# Altium footprint library usb.PcbLib: 20 footprints (part 1 of 2)
Each footprint in its own frame and in the unit in brackets; x right, y up, seen from the top. Pads: shape width x height; smd on the part's side, far side on the other; paste and mask are expansions set on the pad; w line width, h text height; cw(c..) or ccw(c..) is an arc to the next point about the centre after c.
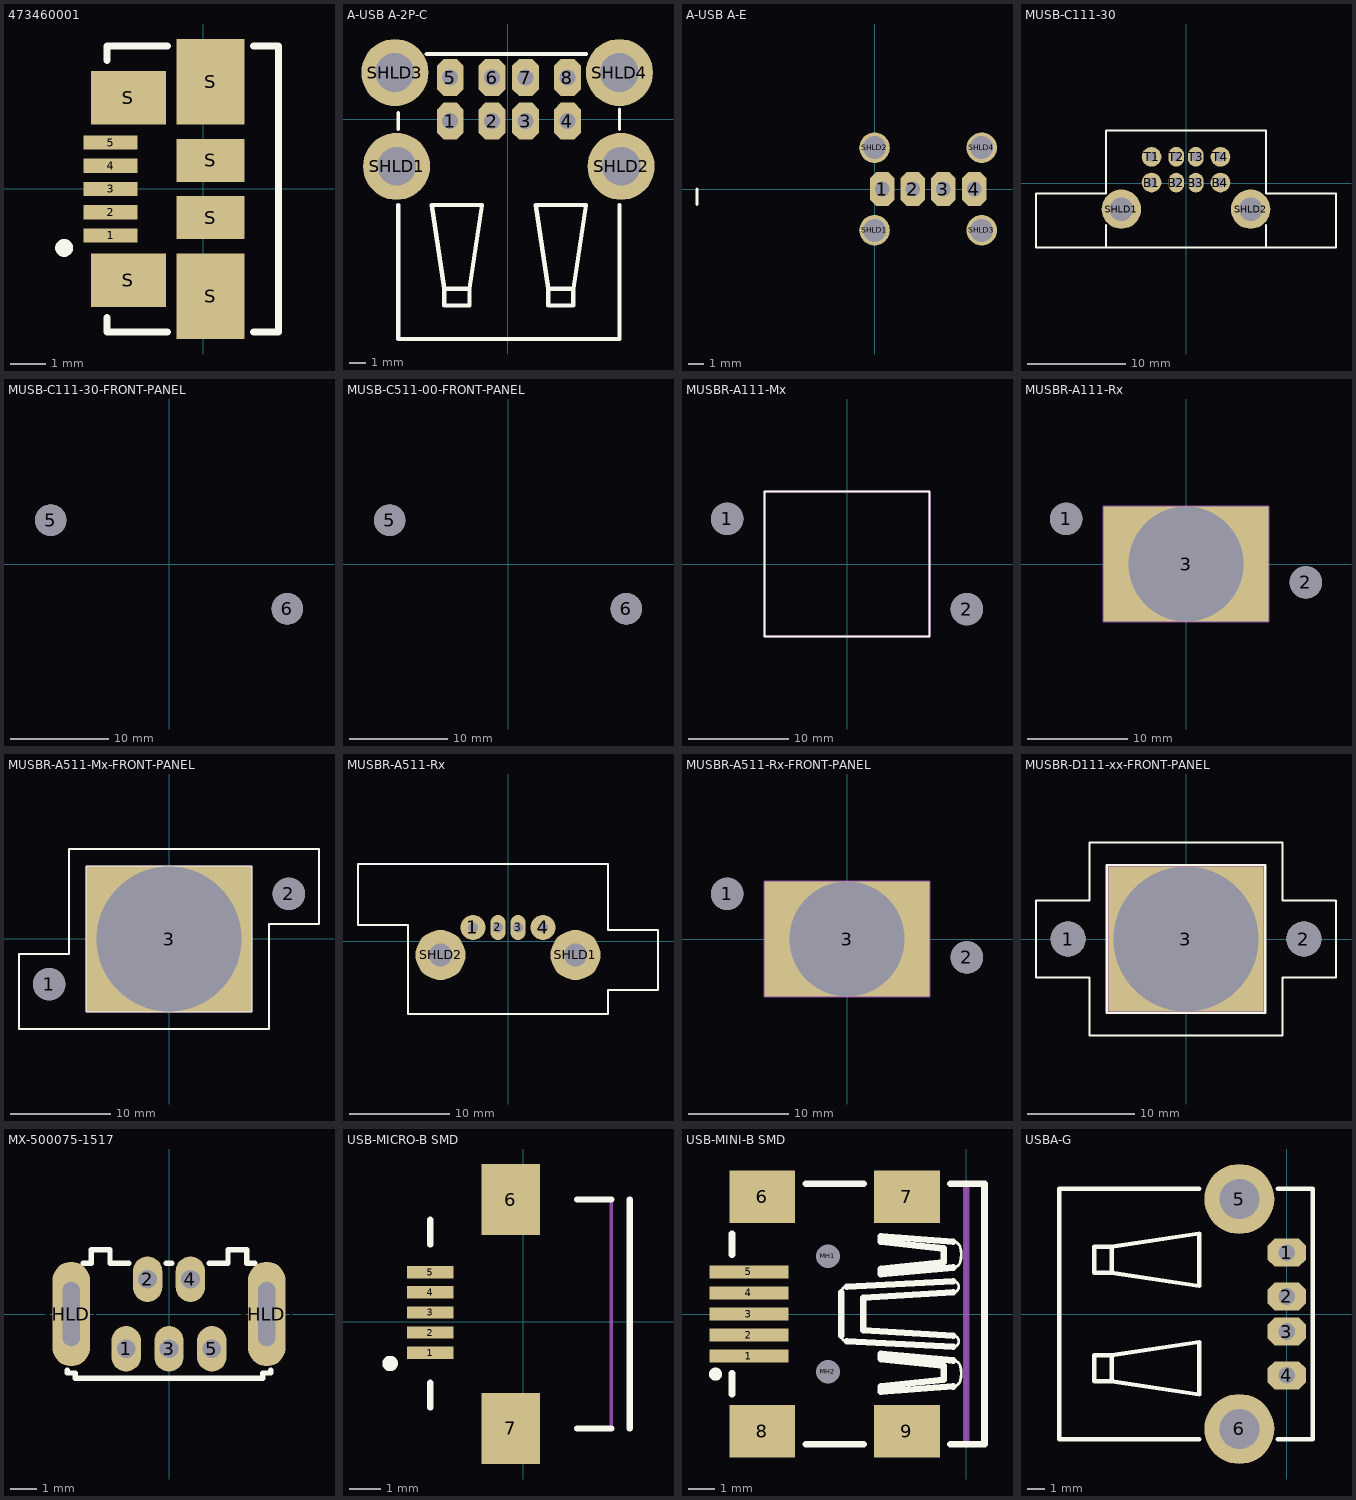
[diagram p0: the footprints below, top view; thin cyan lines are the x and y axes]

## 473460001 [mm] "Molex 473460001 microUSB Connector"
pads (11):
  rect 1.5x0.4 smd: 1(-2.6,-1.3) 2(-2.6,-0.65) 3(-2.6,0) 4(-2.6,0.65) 5(-2.6,1.3)
  rect 2.1x1.5 smd: S(-2.1,-2.55) S(-2.1,2.55)
  rect 1.9x2.4 smd: S(0.2,-3) S(0.2,3)
  rect 1.9x1.2 smd: S(0.2,-0.8) S(0.2,0.8)
Top Overlay:
  circle w0.25: c-3.9,-1.65 r0.125
  lines w0.2: -2.7,-3.6 -2.7,-4 -1,-4 ; -2.7,3.6 -2.7,4 -1,4 ; 1.4,-4 2.1,-4 2.1,4 1.4,4
Mechanical 1:
  lines w0.1: 2.1,-4 2.1,4
  text "PCB Edge" at 3.1,-3.1 h0.8
3D body "473460001.stp": height 2.72, standoff -0.22, extent -2.65,-3.99 2.78,3.99

## A-USB A-2P-C [mm] "ASSMANN WSW USB, style A, dual port, DIP"
pads (12):
  oct 1.6x2.2 hole 0.95: 1(-3.45,-0.1) 2(-0.95,-0.1) 3(1.05,-0.1) 4(3.55,-0.1) 5(-3.45,2.5) 6(-0.95,2.5) 7(1.05,2.5) 8(3.55,2.5)
  round 4 hole 2.3: SHLD1(-6.65,-2.8) SHLD2(6.75,-2.8) SHLD3(-6.75,2.8) SHLD4(6.65,2.8)
Top Overlay:
  lines w0.2: -6.55,-0.6 -6.55,0.4 ; 6.65,-0.6 6.65,0.6
  lines w0.254: -6.55,-5.1 -6.55,-13.1 6.65,-13.1 6.65,-5.1 ; -4.85,3.9 4.65,3.9 ; -3.8,-10.1 -2.3,-10.1 ; -3.8,-10.1 -4.55,-5.1 -1.55,-5.1 -2.3,-10.1 ; -3.8,-10.1 -3.8,-11.1 -2.3,-11.1 -2.3,-10.1 ; 2.4,-10.1 2.4,-11.1 3.9,-11.1 3.9,-10.1 ; 2.4,-10.1 1.65,-5.1 4.65,-5.1 3.9,-10.1 ; 2.4,-10.1 3.9,-10.1
3D body "usb_a-usb_a-2p-c.stp": height 15.6, standoff -3.8, extent -7.8,-13.698 7.9,3.9

## A-USB A-E [mm] "ASSMANN WSW USB, style A, vertical, DIP"
pads (8):
  oct 1.6x2.2 hole 0.95: 1(0.5,0) 2(2.5,0) 3(4.5,0) 4(6.5,0)
  round 2 hole 1.5: SHLD1(0,-2.7) SHLD2(0,2.7) SHLD3(7,-2.7) SHLD4(7,2.7)
Top Overlay:
  lines w0.2: -11.6,-1 -11.6,0
3D body "usb_a-usb_a-e.stp": height 14.55, standoff -3.86, extent -11.6,-3.599 7.6,3.599

## MUSB-C111-30 [mm]
pads (10):
  round 2 hole 1: B1(-3.5,0.045) B4(3.5,0.045) T1(-3.5,2.665) T4(3.5,2.665)
  oval 1.6x2 hole 1: B2(-1,0.045) B3(1,0.045) T2(-1,2.665) T3(1,2.665)
  round 4 hole 2.4: SHLD1(-6.57,-2.665) SHLD2(6.57,-2.665)
Top Overlay:
  lines w0.2: -8.125,-4.265 -8.125,-6.575 ; 8.125,-4.265 8.125,-6.575 ; -8.125,-6.575 -15.25,-6.575 -15.25,-1.165 -15.25,-1.065 -8.125,-1.065 -8.125,5.36 8.125,5.36 8.125,-1.065 15.25,-1.065 15.25,-1.165 15.25,-6.575 8.125,-6.575 ; -8.125,-6.575 8.125,-6.575
3D body "M-MUSB-C111-30-REVT4.STEP": height 19.4, standoff -2.43, extent -15.25,-13.84 15.25,5.36

## MUSB-C111-30-FRONT-PANEL [mm]
pads (2):
  round 3.2 hole 3.2: 5(-12,4.5) 6(12,-4.5)
Bottom Overlay:
  lines w0.2: 9.6,9 ccw(c8.1,9) 8.1,10.5 -8.1,10.5 ccw(c-8.1,9) -9.6,9 -9.6,8.5 cw(c-10.6,8.5) -10.6,7.5 -13.325,7.5 ccw(c-13.325,5.625) -15.2,5.625 -15.2,3.375 ccw(c-13.325,3.375) -13.325,1.5 -10.6,1.5 cw(c-10.6,0.5) -9.6,0.5 -9.6,-8.9 ; -9.6,-8.9 ccw(c-8.1,-8.9) -8.1,-10.4 8.1,-10.4 ccw(c8.1,-8.9) 9.6,-8.9 9.6,-8.5 cw(c10.6,-8.5) 10.6,-7.5 13.325,-7.5 ccw(c13.325,-5.625) 15.2,-5.625 15.2,-3.375 ccw(c13.325,-3.375) 13.325,-1.5 10.6,-1.5 cw(c10.6,-0.5) 9.6,-0.5 9.6,8.9 ; -9.6,-8.9 -9.6,-8.9 ; 9.6,8.9 9.6,8.9
  lines w0.254: -8.25,-9 8.25,-9 8.25,9 -8.25,9 -8.25,-9
3D body "M-MUSB-C111-30-REVT4.STEP": height 15.2, standoff -4, extent -15.25,-11.325 15.25,10.5

## MUSB-C511-00-FRONT-PANEL [mm]
pads (2):
  round 3.2 hole 3.2: 5(-12,4.5) 6(12,-4.5)
Bottom Overlay:
  lines w0.2: 9.6,9 ccw(c8.1,9) 8.1,10.5 -8.1,10.5 ccw(c-8.1,9) -9.6,9 -9.6,8.5 cw(c-10.6,8.5) -10.6,7.5 -13.325,7.5 ccw(c-13.325,5.625) -15.2,5.625 -15.2,3.375 ccw(c-13.325,3.375) -13.325,1.5 -10.6,1.5 cw(c-10.6,0.5) -9.6,0.5 -9.6,-8.9 ; -9.6,-8.9 ccw(c-8.1,-8.9) -8.1,-10.4 8.1,-10.4 ccw(c8.1,-8.9) 9.6,-8.9 9.6,-8.5 cw(c10.6,-8.5) 10.6,-7.5 13.325,-7.5 ccw(c13.325,-5.625) 15.2,-5.625 15.2,-3.375 ccw(c13.325,-3.375) 13.325,-1.5 10.6,-1.5 cw(c10.6,-0.5) 9.6,-0.5 9.6,8.9 ; -9.6,-8.9 -9.6,-8.9 ; 9.6,8.9 9.6,8.9
  lines w0.254: -8.25,-9 -8.25,9 8.25,9 8.25,-9 -8.25,-9
3D body "M-MUSB-C511-00-REVT3.STEP": height 17.76, standoff -4.5, extent -15.25,-10.5 15.25,10.5

## MUSBR-A111-Mx [mm] "AMPHENOL"
pads (2):
  round 3.25 hole 3.25: 1(-12,4.5) 2(12,-4.5)
Top Overlay:
  lines w0.2: -8.275,7.275 -8.25,7.275 ; -8.25,7.275 -8.25,-7.275 8.275,-7.275 8.275,7.25 8.275,7.275 -8.25,7.275
Bottom Overlay:
  lines w0.2: -15,1.5 -10,1.5 -10,-9 10,-9 15,-9 15,-5.5 15,-4 15,-1.5 10,-1.5 10,9 -10,9 -15,9 -15,5.5 -15,4.5 -15,1.5
Mechanical 15:
  lines w0.2: -8.275,-7.275 8.275,-7.275 8.275,7.275 -8.275,7.275 -8.275,-7.275
3D body "M-MUSBR-A111-30-REVT3.STEP": height 3, standoff -14.99, extent -15,-9 15,9

## MUSBR-A111-Rx [mm] "AMPHENOL"
pads (3):
  round 3.25 hole 3.25: 1(-12,4.5) 2(12,-1.85)
  rect 16.55x11.55 hole 11.55 square: 3(0,0)
Bottom Overlay:
  lines w0.2: -15,1.5 -10,1.5 -10,-7.5 8.5,-7.5 10,-7.5 10,-5 15,-5 15,-4 15,1 10,1 10,7.5 -8.5,7.5 -15,7.5 -15,5.5 -15,4.5 -15,1.5
Mechanical 15:
  lines w0.2: -8.275,-5.775 8.275,-5.775 8.275,5.775 -8.275,5.775 -8.275,-5.775
3D body "M-MUSBR-A111-40-REVT3.STEP": height 3, standoff -14.99, extent -15,-7.5 15,7.5

## MUSBR-A511-Mx-FRONT-PANEL [mm] "AMPHENOL"
pads (3):
  round 3.25 hole 3.25: 1(-12,-4.5) 2(12,4.5)
  rect 16.55x14.55 hole 14.55 square: 3(0,0)
Top Overlay:
  lines w0.2: -8.275,-7.275 -8.25,-7.275 ; -8.25,-7.275 8.275,-7.275 8.275,-7.25 8.275,7.275 -8.25,7.275 -8.25,-7.275 ; -15,-9 -15,-5.5 -15,-4.5 -15,-1.5 -10,-1.5 -10,9 10,9 15,9 15,5.5 15,4 15,1.5 10,1.5 10,-9 -10,-9 -15,-9
Mechanical 15:
  lines w0.2: -8.275,-7.275 -8.275,7.275 8.275,7.275 8.275,-7.275 -8.275,-7.275
3D body "M-MUSBR-A511-30-REVT1.STEP": height 18.03, standoff -4, extent -15,-9 15,9

## MUSBR-A511-Rx [mm] "AMPHENOL"
pads (6):
  round 2.5 hole 1: 1(-3.5,1.375) 4(3.5,1.375)
  oval 1.5x2.5 hole 1: 2(-1,1.375) 3(1,1.375)
  round 5 hole 2.3: SHLD1(6.75,-1.375) SHLD2(-6.75,-1.375)
Top Overlay:
  lines w0.2: -15,1.625 -15,4.625 -15,5.625 -15,7.725 10,7.725 10,1.125 15,1.125 15,-3.875 15,-4.875 10,-4.875 10,-7.275 8.4,-7.275 -10,-7.275 -10,1.625 -15,1.625
3D body "M-MUSBR-A511-40-REVT1.STEP": height 18, standoff -4.03, extent -15,-7.275 15,7.725

## MUSBR-A511-Rx-FRONT-PANEL [mm] "AMPHENOL"
pads (3):
  round 3.25 hole 3.25: 1(-12,4.5) 2(12,-1.85)
  rect 16.55x11.55 hole 11.55 square: 3(0,0)
Bottom Overlay:
  lines w0.2: -15,1.5 -10,1.5 -10,-7.5 8.5,-7.5 10,-7.5 10,-5 15,-5 15,-4 15,1 10,1 10,7.5 -8.5,7.5 -15,7.5 -15,5.5 -15,4.5 -15,1.5
Mechanical 15:
  lines w0.2: -8.275,-5.775 8.275,-5.775 8.275,5.775 -8.275,5.775 -8.275,-5.775
3D body "M-MUSBR-A511-40-REVT1.STEP": height 3, standoff -19.03, extent -15,-7.5 15,7.5

## MUSBR-D111-xx-FRONT-PANEL [mm] "AMPHENOL"
pads (3):
  round 3.25 hole 3.25: 1(-11,0) 2(11,0)
  rect 14.5x13.5 hole 13.5 square: 3(0,0)
Top Overlay:
  lines w0.2: -9,-9 9,-9 9,-3.6 14,-3.6 14,3.6 9,3.6 9,9 8.4,9 -9,9 ; -9,9 -9,3.6 -14,3.6 -14,-3.6 -9,-3.6 -9,-9 -8.4,-9 ; -7.4,-6.9 -7.4,6.9 7.4,6.9 7.4,-6.375 7.4,-6.9 -7.4,-6.9
Mechanical 15:
  lines w0.2: -7.3,-6.8 7.3,-6.8 7.3,6.8 -7.3,6.8 -7.3,-6.8
3D body "User Library-MUSB-D111.step": height 2.7, standoff -15.3, extent -14,-9.1 14,9.1

## MX-500075-1517 [mm] "USB On-The-Go (OTG) Mini-B Receptacle, Vertical, Through Hole Solder Tails and Shell Tabs"
pads (7):
  oval 1.1x1.7 hole 0.7: 1(-1.6,-1.3) 2(-0.8,1.3) 3(0,-1.3) 4(0.8,1.3) 5(1.6,-1.3)
  oval 1.4x3.9 hole 0.65 slot 2.4 at 90 deg: SHLD1(-3.65,0) SHLD2(3.65,0)
Top Overlay:
  lines w0.2: -3.8,-2.1 -3.8,-2.2 -3.5,-2.2 -3.5,-2.4 3.5,-2.4 3.5,-2.2 3.8,-2.2 3.8,-2.1 ; -3.2,1.9 -2.9,1.9 -2.9,2.4 -2.4,2.4 -2.2,2.4 -2.2,1.9 -1.5,1.9 ; -0.1,1.9 0.1,1.9 ; 1.5,1.9 2.2,1.9 2.2,2.4 2.4,2.4 2.9,2.4 2.9,1.9 3.2,1.9
3D body "5000751517.stp": height 7.6, standoff -2.2, extent -3.85,-2.3 3.85,2.4

## USB-MICRO-B SMD [mm]
pads (7):
  rect 1.5x0.4 smd: 1(-3,-1) 2(-3,-0.35) 3(-3,0.3) 4(-3,0.95) 5(-3,1.6)
  rect 1.9x2.3 smd: 6(-0.4,3.95) 7(-0.4,-3.45)
Top Overlay:
  circle w0.25: c-4.3,-1.35 r0.125
  lines w0.2: -3,-2.775 -3,-1.975 ; -3,2.5 -3,3.3 ; 1.75,-3.45 2.85,-3.45 ; 1.75,3.95 2.85,3.95 ; 3.45,-3.45 3.45,3.95
Mechanical 1:
  lines w0.1: 2.85,-3.45 2.85,3.95
  text "PCB Edge" at 2.675,-3.275 h0.8
3D body "User Library-Micro USB.step": height 2.72, standoff -0.22, extent -3.23,-3.69 2.2,4.29

## USB-MINI-B SMD [mm]
pads (11):
  rect 3x0.5 smd: 1(-8.255,-1.6) 2(-8.255,-0.8) 3(-8.255,0) 4(-8.255,0.8) 5(-8.255,1.6)
  rect 2.5x2 smd: 6(-7.75,4.45) 7(-2.25,4.45) 8(-7.75,-4.45) 9(-2.25,-4.45)
  round 0.6 hole 0.9 unplated: MH1(-5.25,2.2) MH2(-5.25,-2.2)
Top Overlay:
  circle w0.25: c-9.523,-2.286 r0.125
  lines w0.102: -4.742,-0.831 ccw(c-4.523,-0.819) -4.535,-1.038 ; -4.742,0.83 cw(c-4.523,0.818) -4.535,1.038 ; -0.485,-2.752 ccw(c-0.508,-2.458) -0.226,-2.544 ccw(c-1.157,-2.258) -0.226,-1.973 ccw(c-0.508,-2.059) -0.485,-1.765 ; -0.485,-1.246 ccw(c-0.485,-1.038) -0.278,-1.038 ccw(c-0.485,-1.038) -0.485,-0.831 ; -0.485,0.83 ccw(c-0.485,1.038) -0.278,1.038 ccw(c-0.485,1.038) -0.485,1.246 ; -0.485,1.765 ccw(c-0.508,2.059) -0.226,1.972 ccw(c-1.157,2.258) -0.226,2.543 ccw(c-0.508,2.457) -0.485,2.751
  lines w0.254: -8.9,-3.05 -8.9,-2.25 ; -8.9,2.25 -8.9,3.05 ; -6.1,-4.95 -3.9,-4.95 ; -6.1,4.95 -3.9,4.95 ; -4.742,-0.831 -4.742,0.83 ; -4.535,-1.038 -0.486,-1.246 ; -4.535,1.038 -0.486,1.246 ; -0.6,-4.95 0.7,-4.95 0.7,4.95 -0.6,4.95 ; -0.485,-2.752 -3.237,-2.959 -3.237,-2.752 -0.849,-2.492 -0.849,-1.973 -3.237,-1.713 -3.237,-1.506 -0.485,-1.765 ; -0.485,-0.831 -3.912,-0.623 -3.912,0.623 -0.485,0.83 ; -0.485,1.765 -3.237,1.505 -3.237,1.713 -0.849,1.972 -0.849,2.491 -3.237,2.751 -3.237,2.959 -0.485,2.751
Mechanical 1:
  lines w0.254: 0,-4.95 0,4.95
  text "PCB Edge" at 0.432,-4.036 h0.25
3D body "SW3dPS-USB_mini_B.STEP": height 3.95, standoff -1, extent -8.558,-5.35 0.642,5.35

## USBA-G [mm] "USB-A PCB Angle Socket"
height 7
pads (6):
  oct 2.2x1.6 hole 0.95: 1(0,3.5) 2(0,1) 3(0,-1) 4(0,-3.5)
  round 4 hole 2.3: 5(-2.7,6.57) 6(-2.7,-6.57)
Top Overlay:
  lines w0.254: -5,-7.15 -13,-7.15 -13,7.15 -5,7.15 ; -0.5,-7.15 1.5,-7.15 1.5,7.15 -0.5,7.15 ; -10,-3.85 -11,-3.85 -11,-2.35 -10,-2.35 ; -10,-3.85 -5,-4.6 -5,-1.6 -10,-2.35 ; -10,-3.85 -10,-2.35 ; -10,2.35 -10,3.85 ; -10,2.35 -5,1.6 -5,4.6 -10,3.85 ; -10,2.35 -11,2.35 -11,3.85 -10,3.85
3D body "Samtec-USB-A-S-F-B-TH.step": height 7.4, standoff -3.52, extent -13.019,-7.899 1.081,7.9